# Altium footprint library 二极管封装库.PcbLib: 222 footprints (part 4 of 14)
Each footprint in its own frame and in the unit in brackets; x right, y up, seen from the top. Pads: shape width x height; smd on the part's side, far side on the other; paste and mask are expansions set on the pad; w line width, h text height; cw(c..) or ccw(c..) is an arc to the next point about the centre after c.
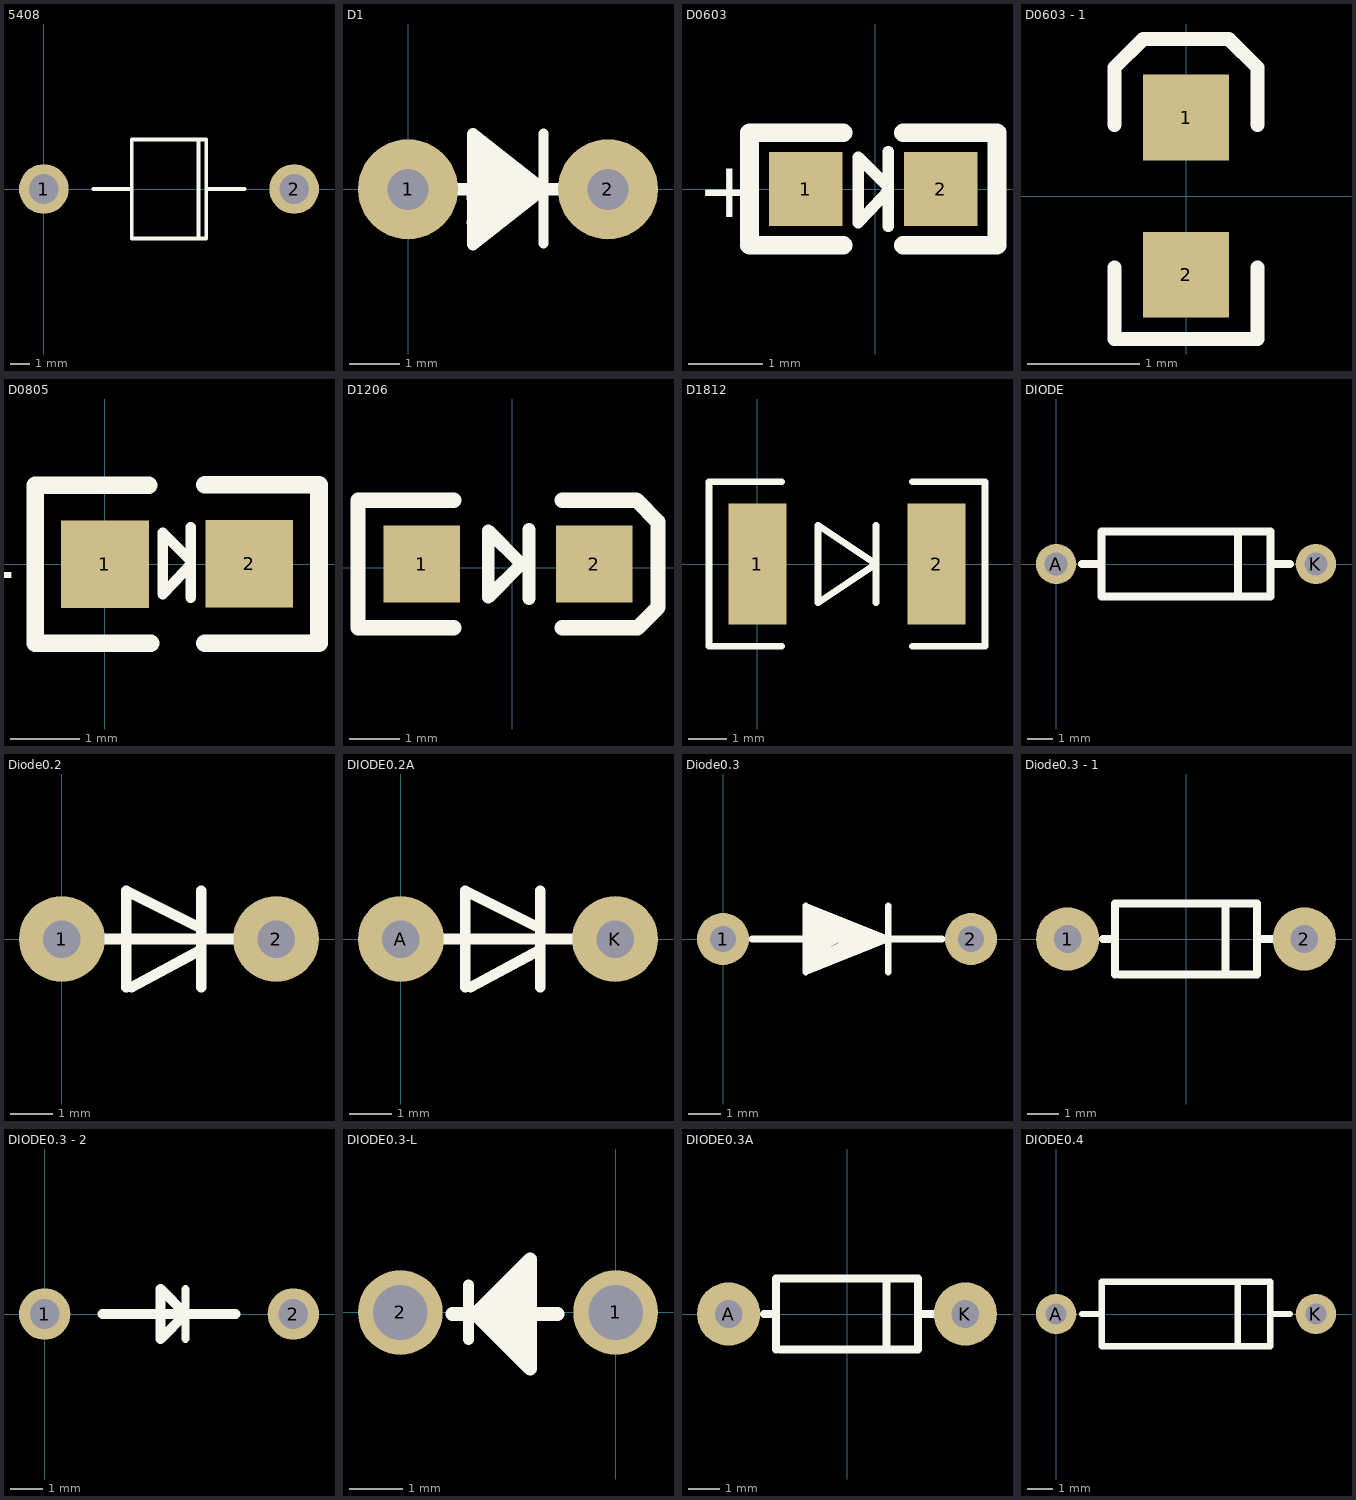
[diagram p3: the footprints below, top view; thin cyan lines are the x and y axes]

## 5408 [mm]
pads (2):
  round 2.5 hole 1.5: 1(0,0) 2(12.6,0)
Top Overlay:
  lines w0.2: 2.5,0 4.425,0 ; 7.775,-2.5 7.775,2.5 ; 8.175,0 10.1,0 ; 4.425,0 4.425,2.5 8.175,2.5 8.175,-2.5 4.425,-2.5 4.425,0

## D1 [mm]
pads (2):
  round 2 hole 0.82: 1(0,0) 2(4,0)
Top Overlay:
  lines w0.2: 2.709,-1.09 2.709,1.11
  lines w0.25: 0.4,0 1.3,0 ; 3.61,0 2.7,0 ; 2.7,0 1.3,1.1 1.3,-1.1 2.7,0
  lines w0.254: 1.638,0.305 1.511,0.305 1.612,0.203 2.273,0.203 2.298,0.229 2.12,0.229 2.095,0.203 1.511,0.787 1.511,0.508 ; 1.866,0.203 1.562,0.508 1.511,0.508 ; 2.425,0 1.3,0 1.3,-0.178 1.351,-0.229 2.374,-0.229 2.247,-0.229 1.993,-0.483 1.478,-0.483 ; 1.478,-0.483 1.3,-0.66 1.714,-0.66 1.511,-0.864 1.325,-0.864 1.478,-0.711 1.478,-0.483 ; 1.478,-0.483 1.511,-0.45 1.511,0.508

## D0603 [mm]
pads (2):
  rect 1x1 smd: 1(-0.94,0) 2(0.889,0)
Top Overlay:
  lines w0.152: 0.178,-0.508 0.178,0.508 ; 0.178,-0.025 -0.229,-0.457 -0.229,0.432 0.178,0.025
  lines w0.254: -0.432,-0.762 -1.702,-0.762 -1.702,0.762 -0.432,0.762 ; 0.381,-0.762 1.651,-0.762 1.651,0.762 0.381,0.762
  text "+" at -2.413,-0.381 h0.76
3D body: height 0.46, standoff 0, extent -0.28,-0.279 0.255,0.279
3D body: height 0.38, standoff 0, extent -0.603,-0.533 0.567,0.533
3D body: height 0.38, standoff 0, extent -1.026,-0.535 -0.602,0.535
3D body: height 0.38, standoff 0, extent 0.563,-0.532 0.988,0.532

## D0603 - 1 [mil]
pads (2):
  rect 30x30 smd: 1(0,27.5) 2(0,-27.5)
Top Overlay:
  lines w5: -25,-25 -25,-50 25,-50 25,-25 ; -25,25 -25,45 -15,55 15,55 25,45 25,25

## D0805 [mil] "1/8W"
pads (2):
  rect 50x50 smd: 1(0,0) 2(82.3,0.2)
Top Overlay:
  lines w6: 49,-19 49,21 ; 49,0 33,-17 33,18 49,2
  lines w10: 25,45 -39.8,45 -39.8,-45 26,-45 ; 57,-45 122,-45 122,45.2 57,45.2
  text "+" at -49,-19 h30
3D body "R0805.STEP": height 21.65, standoff 0, extent 1.43,-24.4 80.17,25.21
3D body: height 18, standoff 0, extent 30.98,-10 52.03,12

## D1206 [mil] "1/4W"
pads (2):
  rect 60x60 smd: 1(-71,3) 2(64,3)
Top Overlay:
  lines w10: 13,-24 13,30 ; -19,-23 7,3 -19,29 -19,-12 -19,-23
  lines w12: -46,-47 -121,-47 -121,53 -46,53 ; 39,-47 98,-47 114,-31 114,36 97,53 39,53
3D body "SOD-80.STEP": height 59.06, standoff 0, extent -72.9,-26.53 64.9,32.53

## D1812 [mil]
pads (2):
  rect 60x125 smd: 1(0,0) 2(185,0)
Top Overlay:
  lines w7: 25,-85 -50,-85 -50,85 25,85 ; 122.5,-40 122.5,40 ; 160,-85 235,-85 235,85 160,85 ; 62.5,-40 62.5,40 122.5,0 62.5,-40

## DIODE [mil]
pads (2):
  round 62 hole 35.43: A(0,0) K(400,0)
Top Overlay:
  lines w12: 40,0 70,0 ; 280,-50 280,50 ; 330,0 360,0 ; 70,-50 70,50 330,50 330,-50 70,-50

## Diode0.2 [mil]
pads (2):
  round 80 hole 35: 1(0,0) 2(200,0)
Top Overlay:
  lines w10: 35,0 160,0 ; 60,-45 60,45 130,10 ; 65,-45 130,-10 ; 130,-45 130,45

## DIODE0.2A [mil]
pads (2):
  round 80 hole 35: A(0,0) K(200,0)
Top Overlay:
  lines w10: 35,0 160,0 ; 60,-45 60,45 130,10 ; 65,-45 130,-10 ; 130,-45 130,45

## Diode0.3 [mm]
pads (2):
  round 1.6 hole 0.8: 1(0,0) 2(7.62,0)
Top Overlay:
  lines w0.203: 0.889,0 6.731,0 ; 2.667,-0.762 2.667,0.889 4.445,0.127 ; 2.794,-0.762 2.794,0.635 4.064,0.127 ; 3.048,0.381 3.683,0 ; 3.429,0 3.048,0.254 3.048,-0.254 3.81,0.127 2.921,0.508 2.921,-0.508 4.064,0 ; 5.08,-1.016 5.08,1.016 ; 2.54,-1.016 2.54,1.016 5.08,0 2.54,-1.016
  lines w0.254: 2.667,-0.762 4.572,0 ; 3.429,0 4.445,0.127

## Diode0.3 - 1 [mil]
pads (2):
  round 80 hole 35: 1(-150,0) 2(150,0)
Top Overlay:
  lines w10: -105,0 -90,0 ; -90,-45 -90,45 90,45 90,-45 -85,-45 ; 50,-45 50,45 ; 90,0 110,0

## DIODE0.3 - 2 [mil]
pads (2):
  round 62 hole 36: 1(0,0) 2(300,0)
Top Overlay:
  lines w10: 170,-30 170,30
  lines w12: 70,0 230,0 ; 140,-30 170,0 140,30 140,-30

## DIODE0.3-L [mil]
pads (2):
  round 62 hole 40: 1(0,0) 2(-157.48,0)
Top Overlay:
  rectangle: -93.08,-8.67 -82.56,5.59
  lines w8: -107.68,-19.76 -107.68,20.24
  lines w10: -119.45,-1.1 -102.56,-1.1 ; -93.08,5.59 -83.43,5.59 ; -70.13,31.33 -70.13,-33.53 -83.43,-20.23 -83.43,5.59 ; -42.56,-1.1 -102.56,-1.1 ; -102.56,-1.1 -62.56,38.9 -62.56,-41.1 -102.56,-1.1 ; -83.43,5.59 -82.56,4.72 -82.56,-8.67 -74.99,-1.1 -74.99,11.33 -74.99,-13.53 -70.13,-18.39 -81.59,-18.39 -83.43,-16.55 -83.43,15.4 -79.94,18.9 -70.13,18.9 -83.43,5.59

## DIODE0.3A [mil]
pads (2):
  round 80 hole 35: A(-150,0) K(150,0)
Top Overlay:
  lines w10: -105,0 -90,0 ; -90,-45 -90,45 90,45 90,-45 -85,-45 ; 50,-45 50,45 ; 90,0 110,0

## DIODE0.4 [mil]
pads (2):
  round 62 hole 32: A(0,0) K(400,0)
Top Overlay:
  lines w10: 40,0 70,0 ; 280,-50 280,50 ; 330,0 360,0 ; 70,-50 330,-50 330,50 70,50 70,-50
3D body "DO-41.STEP": height 58.74, standoff -149.92, extent -19.72,-53.36 415.71,49